# Altium footprint library Active.PcbLib: 325 footprints (part 15 of 23) (continued)
## QFN50P500X500X100-32N1 [mm] "QFN, 32-Leads, Body 5,0x5,0mm (max), Pitch 0,50mm, IPC Medium Density"
height 1
pads (33):
  oval 0.65x0.25 smd mask+0.051: 1(-2.525,1.75) 2(-2.525,1.25) 3(-2.525,0.75) 4(-2.525,0.25) 5(-2.525,-0.25) 6(-2.525,-0.75) 7(-2.525,-1.25) 8(-2.525,-1.75) 17(2.525,-1.75) 18(2.525,-1.25) 19(2.525,-0.75) 20(2.525,-0.25) 21(2.525,0.25) 22(2.525,0.75) 23(2.525,1.25) 24(2.525,1.75)
  oval 0.25x0.65 smd mask+0.051: 9(-1.75,-2.525) 10(-1.25,-2.525) 11(-0.75,-2.525) 12(-0.25,-2.525) 13(0.25,-2.525) 14(0.75,-2.525) 15(1.25,-2.525) 16(1.75,-2.525) 25(1.75,2.525) 26(1.25,2.525) 27(0.75,2.525) 28(0.25,2.525) 29(-0.25,2.525) 30(-0.75,2.525) 31(-1.25,2.525) 32(-1.75,2.525)
  rect 3.95x3.95 smd paste-7 mask-7: 33(0,0)
via -1.2,1.2 diameter 0.65 hole 0.3
via 0,1.2 diameter 0.65 hole 0.3
via 1.2,1.2 diameter 0.65 hole 0.3
via -1.2,0 diameter 0.65 hole 0.3
via 0,0 diameter 0.65 hole 0.3
via 1.2,0 diameter 0.65 hole 0.3
via -1.2,-1.2 diameter 0.65 hole 0.3
via 0,-1.2 diameter 0.65 hole 0.3
via 1.2,-1.2 diameter 0.65 hole 0.3
Top Overlay:
  circle w0.25: c-3.4,1.75 r0.125
  lines w0.2: -2.525,-2.5 -2.5,-2.5 -2.5,-2.525 ; -2.525,2.5 -2.5,2.5 -2.5,2.525 ; 2.5,-2.525 2.5,-2.5 2.525,-2.5 ; 2.5,2.525 2.5,2.5 2.525,2.5
Top Paste:
  region: -1.325,1.925 -1.925,1.925 -1.925,1.3 -1.575,1.3 -1.325,1.55
  region: 1.325,1.925 1.925,1.925 1.925,1.3 1.575,1.3 1.325,1.55
  region: 1.325,-1.925 1.925,-1.925 1.925,-1.3 1.575,-1.3 1.325,-1.55
  region: -1.325,-1.925 -1.925,-1.925 -1.925,-1.3 -1.575,-1.3 -1.325,-1.55
  region: -1.041,0.914 -0.889,1.067 -0.305,1.067 -0.152,0.914 -0.152,0.279 -0.305,0.127 -0.889,0.127 -1.041,0.279
  region: 1.041,0.914 0.889,1.067 0.305,1.067 0.152,0.914 0.152,0.279 0.305,0.127 0.889,0.127 1.041,0.279
  region: 1.041,-0.914 0.889,-1.067 0.305,-1.067 0.152,-0.914 0.152,-0.279 0.305,-0.127 0.889,-0.127 1.041,-0.279
  region: -1.041,-0.914 -0.889,-1.067 -0.305,-1.067 -0.152,-0.914 -0.152,-0.279 -0.305,-0.127 -0.889,-0.127 -1.041,-0.279
  region: -0.889,1.346 -1.016,1.473 -1.016,1.925 -0.152,1.925 -0.152,1.499 -0.305,1.346
  region: 0.305,1.346 0.178,1.473 0.178,1.925 1.041,1.925 1.041,1.499 0.889,1.346
  region: 1.321,0.864 1.448,0.991 1.925,0.991 1.925,0.127 1.473,0.127 1.321,0.279
  region: 1.321,-0.33 1.448,-0.203 1.925,-0.203 1.925,-1.067 1.473,-1.067 1.321,-0.914
  region: 0.889,-1.346 1.016,-1.473 1.016,-1.925 0.152,-1.925 0.152,-1.499 0.305,-1.346
  region: -0.305,-1.346 -0.178,-1.473 -0.178,-1.925 -1.041,-1.925 -1.041,-1.499 -0.889,-1.346
  region: -1.321,-0.864 -1.448,-0.991 -1.925,-0.991 -1.925,-0.127 -1.473,-0.127 -1.321,-0.279
  region: -1.321,0.33 -1.448,0.203 -1.925,0.203 -1.925,1.067 -1.473,1.067 -1.321,0.914
Top Solder:
  drawing of 18 lines, arcs and shapes, not listed
Mechanical 13:
  circle w0.1: c-1.55,1.55 r0.5
  lines w0.1: -2.5,-2.5 -2.5,2.5 2.5,2.5 2.5,-2.5 -2.5,-2.5
Mechanical 15:
  lines w0.1: -0.5,0 0.5,0 ; 0,-0.5 0,0.5 ; -3.1,-3.1 -3.1,3.1 3.1,3.1 3.1,-3.1 -3.1,-3.1
3D body: height 1, standoff 0.05, extent -2.5,-2.5 2.5,2.5
3D body: height 1.01, standoff 1, extent -2.047,1.041 -1.051,2.039

## QFN50P500X500X100-32N2 [mm] "QFN, 32-Leads, Body 5,0x5,0mm (max), Pitch 0,50mm, IPC Medium Density"
height 1
pads (33):
  oval 0.65x0.25 smd mask+0.051: 1(-2.525,1.75) 2(-2.525,1.25) 3(-2.525,0.75) 4(-2.525,0.25) 5(-2.525,-0.25) 6(-2.525,-0.75) 7(-2.525,-1.25) 8(-2.525,-1.75) 17(2.525,-1.75) 18(2.525,-1.25) 19(2.525,-0.75) 20(2.525,-0.25) 21(2.525,0.25) 22(2.525,0.75) 23(2.525,1.25) 24(2.525,1.75)
  oval 0.25x0.65 smd mask+0.051: 9(-1.75,-2.525) 10(-1.25,-2.525) 11(-0.75,-2.525) 12(-0.25,-2.525) 13(0.25,-2.525) 14(0.75,-2.525) 15(1.25,-2.525) 16(1.75,-2.525) 25(1.75,2.525) 26(1.25,2.525) 27(0.75,2.525) 28(0.25,2.525) 29(-0.25,2.525) 30(-0.75,2.525) 31(-1.25,2.525) 32(-1.75,2.525)
  rect 3.6x3.6 smd paste-7 mask-7: 33(0,0)
via -1.2,1.2 diameter 0.65 hole 0.3
via 0,1.2 diameter 0.65 hole 0.3
via 1.2,1.2 diameter 0.65 hole 0.3
via -1.2,0 diameter 0.65 hole 0.3
via 0,0 diameter 0.65 hole 0.3
via 1.2,0 diameter 0.65 hole 0.3
via -1.2,-1.2 diameter 0.65 hole 0.3
via 0,-1.2 diameter 0.65 hole 0.3
via 1.2,-1.2 diameter 0.65 hole 0.3
Top Overlay:
  circle w0.25: c-3.4,1.75 r0.125
  lines w0.2: -2.525,-2.5 -2.5,-2.5 -2.5,-2.525 ; -2.525,2.5 -2.5,2.5 -2.5,2.525 ; 2.5,-2.525 2.5,-2.5 2.525,-2.5 ; 2.5,2.525 2.5,2.5 2.525,2.5
Top Paste:
  region: -1.041,0.914 -0.889,1.067 -0.305,1.067 -0.152,0.914 -0.152,0.279 -0.305,0.127 -0.889,0.127 -1.041,0.279
  region: 1.041,0.914 0.889,1.067 0.305,1.067 0.152,0.914 0.152,0.279 0.305,0.127 0.889,0.127 1.041,0.279
  region: 1.041,-0.914 0.889,-1.067 0.305,-1.067 0.152,-0.914 0.152,-0.279 0.305,-0.127 0.889,-0.127 1.041,-0.279
  region: -1.041,-0.914 -0.889,-1.067 -0.305,-1.067 -0.152,-0.914 -0.152,-0.279 -0.305,-0.127 -0.889,-0.127 -1.041,-0.279
  region: -0.889,1.346 -1.016,1.473 -1.016,1.725 -0.152,1.725 -0.152,1.499 -0.305,1.346
  region: 0.305,1.346 0.178,1.473 0.178,1.725 1.041,1.725 1.041,1.499 0.889,1.346
  region: 1.321,0.864 1.448,0.991 1.725,0.991 1.725,0.127 1.473,0.127 1.321,0.279
  region: 1.321,-0.33 1.448,-0.203 1.725,-0.203 1.725,-1.067 1.473,-1.067 1.321,-0.914
  region: 0.889,-1.346 1.016,-1.473 1.016,-1.75 0.152,-1.75 0.152,-1.499 0.305,-1.346
  region: -0.305,-1.346 -0.178,-1.473 -0.178,-1.75 -1.041,-1.75 -1.041,-1.499 -0.889,-1.346
  region: -1.321,-0.864 -1.448,-0.991 -1.75,-0.991 -1.75,-0.127 -1.473,-0.127 -1.321,-0.279
  region: -1.321,0.33 -1.448,0.203 -1.75,0.203 -1.75,1.067 -1.473,1.067 -1.321,0.914
Top Solder:
  drawing of 18 lines, arcs and shapes, not listed
Mechanical 13:
  circle w0.1: c-1.55,1.55 r0.5
  lines w0.1: -2.5,-2.5 -2.5,2.5 2.5,2.5 2.5,-2.5 -2.5,-2.5
Mechanical 15:
  lines w0.1: -0.5,0 0.5,0 ; 0,-0.5 0,0.5 ; -3.1,-3.1 -3.1,3.1 3.1,3.1 3.1,-3.1 -3.1,-3.1
3D body: height 1, standoff 0.05, extent -2.5,-2.5 2.5,2.5
3D body: height 1.01, standoff 1, extent -2.047,1.041 -1.051,2.039

## QFN50P500X500X100-32N-1 [mm] "QFN, 32-Leads, Body 5,0x5,0mm (max), Pitch 0,50mm, IPC Medium Density"
height 1
pads (33):
  oval 0.65x0.25 smd mask+0.051: 1(-2.525,1.75) 2(-2.525,1.25) 3(-2.525,0.75) 4(-2.525,0.25) 5(-2.525,-0.25) 6(-2.525,-0.75) 7(-2.525,-1.25) 8(-2.525,-1.75) 17(2.525,-1.75) 18(2.525,-1.25) 19(2.525,-0.75) 20(2.525,-0.25) 21(2.525,0.25) 22(2.525,0.75) 23(2.525,1.25) 24(2.525,1.75)
  oval 0.25x0.65 smd mask+0.051: 9(-1.75,-2.525) 10(-1.25,-2.525) 11(-0.75,-2.525) 12(-0.25,-2.525) 13(0.25,-2.525) 14(0.75,-2.525) 15(1.25,-2.525) 16(1.75,-2.525) 25(1.75,2.525) 26(1.25,2.525) 27(0.75,2.525) 28(0.25,2.525) 29(-0.25,2.525) 30(-0.75,2.525) 31(-1.25,2.525) 32(-1.75,2.525)
  rect 3.3x3.3 smd paste-7 mask-7: 33(0,0)
via -1.27,1.27 diameter 0.559 hole 0.25
via 0,1.27 diameter 0.559 hole 0.25
via 1.27,1.27 diameter 0.559 hole 0.25
via -1.27,0 diameter 0.559 hole 0.25
via 0,0 diameter 0.559 hole 0.25
via 1.27,0 diameter 0.559 hole 0.25
via -1.27,-1.27 diameter 0.559 hole 0.25
via 0,-1.27 diameter 0.559 hole 0.25
via 1.27,-1.27 diameter 0.559 hole 0.25
Top Overlay:
  circle w0.25: c-2.843,2.413 r0.125
Top Paste:
  region: -1.092,0.991 -0.991,1.092 -0.279,1.092 -0.127,0.94 -0.127,0.305 -0.305,0.127 -0.94,0.127 -1.092,0.279
  region: -0.965,1.346 -1.118,1.499 -1.118,1.651 -0.152,1.651 -0.152,1.499 -0.305,1.346
  region: -1.346,0.965 -1.499,1.118 -1.651,1.118 -1.651,0.152 -1.499,0.152 -1.346,0.305
  region: -0.965,-1.346 -1.118,-1.499 -1.118,-1.651 -0.152,-1.651 -0.152,-1.499 -0.305,-1.346
  region: -1.346,-0.965 -1.499,-1.118 -1.651,-1.118 -1.651,-0.152 -1.499,-0.152 -1.346,-0.305
  region: 1.346,-0.965 1.499,-1.118 1.651,-1.118 1.651,-0.152 1.499,-0.152 1.346,-0.305
  region: 0.965,-1.346 1.118,-1.499 1.118,-1.651 0.152,-1.651 0.152,-1.499 0.305,-1.346
  region: 0.965,1.346 1.118,1.499 1.118,1.651 0.152,1.651 0.152,1.499 0.305,1.346
  region: 1.346,0.965 1.499,1.118 1.651,1.118 1.651,0.152 1.499,0.152 1.346,0.305
  region: -0.991,-1.092 -1.092,-0.991 -1.092,-0.279 -0.94,-0.127 -0.305,-0.127 -0.127,-0.305 -0.127,-0.94 -0.279,-1.092
  region: 1.092,-0.991 0.991,-1.092 0.279,-1.092 0.127,-0.94 0.127,-0.305 0.305,-0.127 0.94,-0.127 1.092,-0.279
  region: 0.991,1.092 1.092,0.991 1.092,0.279 0.94,0.127 0.305,0.127 0.127,0.305 0.127,0.94 0.279,1.092
Top Solder:
  drawing of 18 lines, arcs and shapes, not listed
Mechanical 13:
  circle w0.1: c-1.55,1.55 r0.5
  lines w0.1: -2.5,-2.5 -2.5,2.5 2.5,2.5 2.5,-2.5 -2.5,-2.5
Mechanical 15:
  lines w0.1: -0.5,0 0.5,0 ; 0,-0.5 0,0.5 ; -3.1,-3.1 -3.1,3.1 3.1,3.1 3.1,-3.1 -3.1,-3.1
3D body: height 1, standoff 0.05, extent -2.5,-2.5 2.5,2.5
3D body: height 1.01, standoff 1, extent -2.047,1.041 -1.051,2.039

## QFN50P600X500X75-36N [mm] "QFN, 36-Leads, Body 6,0x5,0mm (max), Pitch 0,50mm, IPC Medium Density"
height 0.75
pads (30):
  oval 0.85x0.25 smd mask+0.038: 1(-2.425,2.25) 2(-2.425,1.75) 3(-2.425,1.25) 4(-2.425,0.75) 6(-2.425,-0.25) 8(-2.425,-1.25) 9(-2.425,-1.75) 10(-2.425,-2.25) 20(2.425,-1.75) 21(2.425,-1.25) 23(2.425,-0.25) 24(2.425,0.25) 25(2.425,0.75) 27(2.425,1.75) 28(2.425,2.25)
  oval 0.25x0.85 smd mask+0.038: 12(-1.25,-2.925) 13(-0.75,-2.925) 14(-0.25,-2.925) 15(0.25,-2.925) 16(0.75,-2.925) 17(1.25,-2.925) 30(1.25,2.925) 31(0.75,2.925) 32(0.25,2.925) 33(-0.25,2.925) 34(-0.75,2.925) 35(-1.25,2.925) 36(-1.75,2.925)
  rrect50% 3x1.88 smd mask+0.038: 37(0,1.06)
  rrect50% 3x1.53 smd mask+0.038: 38(0,-1.245)
Top Overlay:
  circle w0.25: c-3.475,2.6 r0.125
  lines w0.15: -2.85,-2.85 -2.85,-3.35 -2.35,-3.35 ; -2.85,2.85 -2.85,3.35 -2.35,3.35 ; 2,3.7 2.5,3.7 2.5,3.2 ; 2.35,-3.35 2.85,-3.35 2.85,-2.85
Mechanical 13:
  circle w0.1: c-1.425,2.05 r0.5
  lines w0.1: -2.5,-3 2.5,-3 2.5,3 -2.5,3 -2.5,-3
Mechanical 15:
  lines w0.1: -0.313,0 0.312,0 ; 0,-0.313 0,0.312 ; -3.1,-3.6 3.1,-3.6 3.1,3.6 -3.1,3.6 -3.1,-3.6
3D body: height 0.75, standoff 0.75, extent -1.822,1.642 -1.022,2.442
3D body: height 0.75, standoff 0, extent -2.5,-3 2.5,3

## QFN50P700X800X75-52N [mm] "QFN, 52-Leads, Body 8,0x7,0mm (max), Pitch 0,50mm, IPC Medium Density"
height 0.75
pads (53):
  oval 0.65x0.3 smd mask+0.05: 1(-3.525,3.25) 2(-3.525,2.75) 3(-3.525,2.25) 4(-3.525,1.75) 5(-3.525,1.25) 6(-3.525,0.75) 7(-3.525,0.25) 8(-3.525,-0.25) 9(-3.525,-0.75) 10(-3.525,-1.25) 11(-3.525,-1.75) 12(-3.525,-2.25) 13(-3.525,-2.75) 14(-3.525,-3.25) 27(3.525,-3.25) 28(3.525,-2.75) 29(3.525,-2.25) 30(3.525,-1.75) 31(3.525,-1.25) 32(3.525,-0.75) 33(3.525,-0.25) 34(3.525,0.25) 35(3.525,0.75) 36(3.525,1.25) 37(3.525,1.75) 38(3.525,2.25) 39(3.525,2.75) 40(3.525,3.25)
  oval 0.3x0.65 smd mask+0.05: 15(-2.75,-4.025) 16(-2.25,-4.025) 17(-1.75,-4.025) 18(-1.25,-4.025) 19(-0.75,-4.025) 20(-0.25,-4.025) 21(0.25,-4.025) 22(0.75,-4.025) 23(1.25,-4.025) 24(1.75,-4.025) 25(2.25,-4.025) 26(2.75,-4.025) 41(2.75,4.025) 42(2.25,4.025) 43(1.75,4.025) 44(1.25,4.025) 45(0.75,4.025) 46(0.25,4.025) 47(-0.25,4.025) 48(-0.75,4.025) 49(-1.25,4.025) 50(-1.75,4.025) 51(-2.25,4.025) 52(-2.75,4.025)
  rect 5.5x6.5 smd mask-5: 53(0,0)
via -2.4,2.4 diameter 0.66 hole 0.33
via -1.2,2.4 diameter 0.66 hole 0.33
via 0,2.4 diameter 0.66 hole 0.33
via 1.2,2.4 diameter 0.66 hole 0.33
via 2.4,2.4 diameter 0.66 hole 0.33
via -2.4,1.2 diameter 0.66 hole 0.33
via -1.2,1.2 diameter 0.66 hole 0.33
via 0,1.2 diameter 0.66 hole 0.33
via 1.2,1.2 diameter 0.66 hole 0.33
via 2.4,1.2 diameter 0.66 hole 0.33
via -2.4,0 diameter 0.66 hole 0.33
via -1.2,0 diameter 0.66 hole 0.33
via 0,0 diameter 0.66 hole 0.33
via 1.2,0 diameter 0.66 hole 0.33
via 2.4,0 diameter 0.66 hole 0.33
via -2.4,-1.2 diameter 0.66 hole 0.33
via -1.2,-1.2 diameter 0.66 hole 0.33
via 0,-1.2 diameter 0.66 hole 0.33
via 1.2,-1.2 diameter 0.66 hole 0.33
via 2.4,-1.2 diameter 0.66 hole 0.33
via -2.4,-2.4 diameter 0.66 hole 0.33
via -1.2,-2.4 diameter 0.66 hole 0.33
via 0,-2.4 diameter 0.66 hole 0.33
via 1.2,-2.4 diameter 0.66 hole 0.33
via 2.4,-2.4 diameter 0.66 hole 0.33
Top Overlay:
  circle w0.25: c-4.4,3.25 r0.125
  lines w0.15: -3.525,-4 -3.5,-4 -3.5,-3.525 ; -3.525,4 -3.5,4 -3.5,3.525 ; 3.5,-3.525 3.5,-4 3.525,-4 ; 3.5,3.525 3.5,4 3.525,4
Mechanical 13:
  circle w0.1: c-2.55,3.05 r0.5
  lines w0.1: -3.5,-4 -3.5,4 3.5,4 3.5,-4 -3.5,-4
Mechanical 15:
  lines w0.1: -0.5,0 0.5,0 ; 0,-0.5 0,0.5 ; -4.1,-4.6 -4.1,4.6 4.1,4.6 4.1,-4.6 -4.1,-4.6
3D body: height 0.75, standoff 0.05, extent -3.5,-4 3.5,4

## QFN50P800X800X100-56N [mm] "QFN, 56-Leads, Body 8,0x8,0mm (max), Pitch 0,50mm, IPC Medium Density"
height 1
pads (57):
  oval 0.65x0.25 smd mask+0.038: 1(-4.025,3.25) 2(-4.025,2.75) 3(-4.025,2.25) 4(-4.025,1.75) 5(-4.025,1.25) 6(-4.025,0.75) 7(-4.025,0.25) 8(-4.025,-0.25) 9(-4.025,-0.75) 10(-4.025,-1.25) 11(-4.025,-1.75) 12(-4.025,-2.25) 13(-4.025,-2.75) 14(-4.025,-3.25) 29(4.025,-3.25) 30(4.025,-2.75) 31(4.025,-2.25) 32(4.025,-1.75) 33(4.025,-1.25) 34(4.025,-0.75) 35(4.025,-0.25) 36(4.025,0.25) 37(4.025,0.75) 38(4.025,1.25) 39(4.025,1.75) 40(4.025,2.25) 41(4.025,2.75) 42(4.025,3.25)
  oval 0.25x0.65 smd mask+0.038: 15(-3.25,-4.025) 16(-2.75,-4.025) 17(-2.25,-4.025) 18(-1.75,-4.025) 19(-1.25,-4.025) 20(-0.75,-4.025) 21(-0.25,-4.025) 22(0.25,-4.025) 23(0.75,-4.025) 24(1.25,-4.025) 25(1.75,-4.025) 26(2.25,-4.025) 27(2.75,-4.025) 28(3.25,-4.025) 43(3.25,4.025) 44(2.75,4.025) 45(2.25,4.025) 46(1.75,4.025) 47(1.25,4.025) 48(0.75,4.025) 49(0.25,4.025) 50(-0.25,4.025) 51(-0.75,4.025) 52(-1.25,4.025) 53(-1.75,4.025) 54(-2.25,4.025) 55(-2.75,4.025) 56(-3.25,4.025)
  rect 6x6 smd paste-5 mask-5: 57(0,0)
via 1.8,-1.8 diameter 0.65 hole 0.3
via 0.6,-1.8 diameter 0.65 hole 0.3
via -0.6,-1.8 diameter 0.65 hole 0.3
via -1.8,-1.8 diameter 0.65 hole 0.3
via 1.8,-0.6 diameter 0.65 hole 0.3
via 0.6,-0.6 diameter 0.65 hole 0.3
via -0.6,-0.6 diameter 0.65 hole 0.3
via -1.8,-0.6 diameter 0.65 hole 0.3
via 1.8,0.6 diameter 0.65 hole 0.3
via 0.6,0.6 diameter 0.65 hole 0.3
via -0.6,0.6 diameter 0.65 hole 0.3
via -1.8,0.6 diameter 0.65 hole 0.3
via 1.8,1.8 diameter 0.65 hole 0.3
via 0.6,1.8 diameter 0.65 hole 0.3
via -0.6,1.8 diameter 0.65 hole 0.3
via -1.8,1.8 diameter 0.65 hole 0.3
Top Overlay:
  circle w0.25: c-4.9,3.25 r0.125
  lines w0.15: -4,-3.5 -4,-4 -3.5,-4 ; -4,3.5 -4,4 -3.5,4 ; 3.5,-4 4,-4 4,-3.5 ; 3.5,4 4,4 4,3.5
Top Paste:
  drawing of 25 lines, arcs and shapes, not listed
Top Solder:
  drawing of 1 lines, arcs and shapes, not listed
Mechanical 13:
  circle w0.1: c-3.114,3.192 r0.4
  lines w0.1: -4,-4 4,-4 4,4 -4,4 -4,-4
Mechanical 15:
  lines w0.1: -0.5,0 0.5,0 ; 0,-0.5 0,0.5 ; -4.6,-4.6 4.6,-4.6 4.6,4.6 -4.6,4.6 -4.6,-4.6
3D body: height 0.2, standoff 0.01, extent -4,-4 4,4
3D body: height 1, standoff 0.2, extent -3.85,-3.85 3.85,3.85
3D body: height 1.01, standoff 1, extent -3.522,2.792 -2.722,3.592

## QFN50P1000X1000X85-72N_EPSHIFT [mm] "QFN, 72-Leads, Body 10,0x10,0mm (max), Pitch 0,50mm, IPC Medium Density"
height 0.85
pads (73):
  oval 0.7x0.25 smd: 1(-5,4.25) 2(-5,3.75) 3(-5,3.25) 4(-5,2.75) 5(-5,2.25) 6(-5,1.75) 7(-5,1.25) 8(-5,0.75) 9(-5,0.25) 10(-5,-0.25) 11(-5,-0.75) 12(-5,-1.25) 13(-5,-1.75) 14(-5,-2.25) 15(-5,-2.75) 16(-5,-3.25) 17(-5,-3.75) 18(-5,-4.25) 37(5,-4.25) 38(5,-3.75) 39(5,-3.25) 40(5,-2.75) 41(5,-2.25) 42(5,-1.75) 43(5,-1.25) 44(5,-0.75) 45(5,-0.25) 46(5,0.25) 47(5,0.75) 48(5,1.25) 49(5,1.75) 50(5,2.25) 51(5,2.75) 52(5,3.25) 53(5,3.75) 54(5,4.25)
  oval 0.25x0.7 smd: 19(-4.25,-5) 20(-3.75,-5) 21(-3.25,-5) 22(-2.75,-5) 23(-2.25,-5) 24(-1.75,-5) 25(-1.25,-5) 26(-0.75,-5) 27(-0.25,-5) 28(0.25,-5) 29(0.75,-5) 30(1.25,-5) 31(1.75,-5) 32(2.25,-5) 33(2.75,-5) 34(3.25,-5) 35(3.75,-5) 36(4.25,-5) 55(4.25,5) 56(3.75,5) 57(3.25,5) 58(2.75,5) 59(2.25,5) 60(1.75,5) 61(1.25,5) 62(0.75,5) 63(0.25,5) 64(-0.25,5) 65(-0.75,5) 66(-1.25,5) 67(-1.75,5) 68(-2.25,5) 69(-2.75,5) 70(-3.25,5) 71(-3.75,5) 72(-4.25,5)
  rect 7.2x6 smd mask-5: 73(-0.55,0)
via -3.55,2.4 diameter 0.66 hole 0.33
via -2.35,2.4 diameter 0.66 hole 0.33
via -1.15,2.4 diameter 0.66 hole 0.33
via 0.05,2.4 diameter 0.66 hole 0.33
via 1.25,2.4 diameter 0.66 hole 0.33
via 2.45,2.4 diameter 0.66 hole 0.33
via -3.55,1.2 diameter 0.66 hole 0.33
via -2.35,1.2 diameter 0.66 hole 0.33
via -1.15,1.2 diameter 0.66 hole 0.33
via 0.05,1.2 diameter 0.66 hole 0.33
via 1.25,1.2 diameter 0.66 hole 0.33
via 2.45,1.2 diameter 0.66 hole 0.33
via -3.55,0 diameter 0.66 hole 0.33
via -2.35,0 diameter 0.66 hole 0.33
via -1.15,0 diameter 0.66 hole 0.33
via 0.05,0 diameter 0.66 hole 0.33
via 1.25,0 diameter 0.66 hole 0.33
via 2.45,0 diameter 0.66 hole 0.33
via -3.55,-1.2 diameter 0.66 hole 0.33
via -2.35,-1.2 diameter 0.66 hole 0.33
via -1.15,-1.2 diameter 0.66 hole 0.33
via 0.05,-1.2 diameter 0.66 hole 0.33
via 1.25,-1.2 diameter 0.66 hole 0.33
via 2.45,-1.2 diameter 0.66 hole 0.33
via -3.55,-2.4 diameter 0.66 hole 0.33
via -2.35,-2.4 diameter 0.66 hole 0.33
via -1.15,-2.4 diameter 0.66 hole 0.33
via 0.05,-2.4 diameter 0.66 hole 0.33
via 1.25,-2.4 diameter 0.66 hole 0.33
via 2.45,-2.4 diameter 0.66 hole 0.33
Top Overlay:
  circle w0.25: c-5.9,4.25 r0.125
  lines w0.2: -5,-4.525 -5,-5 -4.525,-5 ; -5,4.525 -5,5 -4.525,5 ; 4.525,-5 5,-5 5,-4.525 ; 4.525,5 5,5 5,4.525
Mechanical 13:
  circle w0.1: c-4.05,4.05 r0.5
  lines w0.1: -5,-5 -5,5 5,5 5,-5 -5,-5
Mechanical 15:
  lines w0.1: -1.05,0 -0.05,0 ; -0.55,-0.5 -0.55,0.5 ; -5.6,-5.6 -5.6,5.6 5.6,5.6 5.6,-5.6 -5.6,-5.6
3D body: height 0.85, standoff 0.05, extent -5,-5 5,5

## QFN64-LT [mm] "QFN64; 64 Leads; Body Width 9.0 mm; Pitch 0.5 mm"
pads (65):
  rect 1.2x0.3 smd mask+0.051: 1(-4.65,3.75) 2(-4.65,3.25) 3(-4.65,2.75) 4(-4.65,2.25) 5(-4.65,1.75) 6(-4.65,1.25) 7(-4.65,0.75) 8(-4.65,0.25) 9(-4.65,-0.25) 10(-4.65,-0.75) 11(-4.65,-1.25) 12(-4.65,-1.75) 13(-4.65,-2.25) 14(-4.65,-2.75) 15(-4.65,-3.25) 16(-4.65,-3.75) 33(4.65,-3.75) 34(4.65,-3.25) 35(4.65,-2.75) 36(4.65,-2.25) 37(4.65,-1.75) 38(4.65,-1.25) 39(4.65,-0.75) 40(4.65,-0.25) 41(4.65,0.25) 42(4.65,0.75) 43(4.65,1.25) 44(4.65,1.75) 45(4.65,2.25) 46(4.65,2.75) 47(4.65,3.25) 48(4.65,3.75)
  rect 0.3x1.2 smd mask+0.051: 17(-3.75,-4.65) 18(-3.25,-4.65) 19(-2.75,-4.65) 20(-2.25,-4.65) 21(-1.75,-4.65) 22(-1.25,-4.65) 23(-0.75,-4.65) 24(-0.25,-4.65) 25(0.25,-4.65) 26(0.75,-4.65) 27(1.25,-4.65) 28(1.75,-4.65) 29(2.25,-4.65) 30(2.75,-4.65) 31(3.25,-4.65) 32(3.75,-4.65) 49(3.75,4.65) 50(3.25,4.65) 51(2.75,4.65) 52(2.25,4.65) 53(1.75,4.65) 54(1.25,4.65) 55(0.75,4.65) 56(0.25,4.65) 57(-0.25,4.65) 58(-0.75,4.65) 59(-1.25,4.65) 60(-1.75,4.65) 61(-2.25,4.65) 62(-2.75,4.65) 63(-3.25,4.65) 64(-3.75,4.65)
  rect 7.15x7.15 smd paste-5 mask+0.102: 65(0,0)
via -2.5,-2.5 diameter 0.7 hole 0.3
via -1.25,-2.5 diameter 0.7 hole 0.3
via 0,-2.5 diameter 0.7 hole 0.3
via 1.25,-2.5 diameter 0.7 hole 0.3
via 2.5,-2.5 diameter 0.7 hole 0.3
via 2.5,-1.25 diameter 0.7 hole 0.3
via 1.25,-1.25 diameter 0.7 hole 0.3
via 0,-1.25 diameter 0.7 hole 0.3
via -1.25,-1.25 diameter 0.7 hole 0.3
via -2.5,-1.25 diameter 0.7 hole 0.3
via -2.5,0 diameter 0.7 hole 0.3
via -1.25,0 diameter 0.7 hole 0.3
via -1.25,1.25 diameter 0.7 hole 0.3
via -2.5,1.25 diameter 0.7 hole 0.3
via -2.5,2.5 diameter 0.7 hole 0.3
via -1.25,2.5 diameter 0.7 hole 0.3
via 0,2.5 diameter 0.7 hole 0.3
via 0,1.25 diameter 0.7 hole 0.3
via 1.25,1.25 diameter 0.7 hole 0.3
via 1.25,2.5 diameter 0.7 hole 0.3
via 2.5,2.5 diameter 0.7 hole 0.3
via 2.5,1.25 diameter 0.7 hole 0.3
via 2.5,0 diameter 0.7 hole 0.3
via 1.25,0 diameter 0.7 hole 0.3
via 0,0 diameter 0.7 hole 0.3
Top Overlay:
  circle w0.254: c-5.586,4.267 r0.1
  lines w0.127: -5.186,-4.05 -5.186,-4.339 -4.339,-5.186 -4.05,-5.186 ; -5.186,4.05 -5.186,4.339 -4.339,5.186 -4.05,5.186 ; 4.05,-5.186 4.339,-5.186 5.186,-4.339 5.186,-4.05 ; 4.05,5.186 4.339,5.186 5.186,4.339 5.186,4.05
Top Paste:
  drawing of 36 lines, arcs and shapes, not listed
Top Solder:
  drawing of 1 lines, arcs and shapes, not listed
Mechanical 12:
  circle w0.4: c2.5,-2.5 r0.15
  circle w0.4: c1.25,-2.5 r0.15
  circle w0.4: c0,-2.5 r0.15
  circle w0.4: c-1.25,-2.5 r0.15
  circle w0.4: c-2.5,-2.5 r0.15
  circle w0.4: c2.5,-1.25 r0.15
  circle w0.4: c1.25,-1.25 r0.15
  circle w0.4: c0,-1.25 r0.15
  circle w0.4: c-1.25,-1.25 r0.15
  circle w0.4: c-2.5,-1.25 r0.15
  circle w0.4: c2.5,0 r0.15
  circle w0.4: c1.25,0 r0.15
  circle w0.4: c0,0 r0.15
  circle w0.4: c-1.25,0 r0.15
  circle w0.4: c-2.5,0 r0.15
  circle w0.4: c2.5,1.25 r0.15
  circle w0.4: c1.25,1.25 r0.15
  circle w0.4: c0,1.25 r0.15
  circle w0.4: c-1.25,1.25 r0.15
  circle w0.4: c-2.5,1.25 r0.15
  circle w0.4: c2.5,2.5 r0.15
  circle w0.4: c1.25,2.5 r0.15
  circle w0.4: c0,2.5 r0.15
  circle w0.4: c-1.25,2.5 r0.15
  circle w0.4: c-2.5,2.5 r0.15
Mechanical 13:
  circle w0.127: c-3.5,3.5 r0.4
  lines w0.127: -4.5,-4.5 -4.5,4.5 4.5,4.5 4.5,-4.5 -4.5,-4.5
Mechanical 15:
  lines w0.1: -0.5,0 0.5,0 ; 0,-0.5 0,0.5
  lines w0.102: -5.715,-4.191 -5.715,4.191 -4.191,5.715 4.191,5.715 5.715,4.191 5.715,-4.191 4.191,-5.715 -4.191,-5.715 -5.715,-4.191
3D body: height 0.75, standoff 0, extent -4.5,-4.5 4.5,4.5
3D body: height 0.76, standoff 0.75, extent -3.9,3.1 -3.1,3.9

## QFN64LT-2 [mm]
height 0.75
pads (65):
  oval 0.65x0.3 smd mask+0.038: 1(-4.425,3.75) 2(-4.425,3.25) 3(-4.425,2.75) 4(-4.425,2.25) 5(-4.425,1.75) 6(-4.425,1.25) 7(-4.425,0.75) 8(-4.425,0.25) 9(-4.425,-0.25) 10(-4.425,-0.75) 11(-4.425,-1.25) 12(-4.425,-1.75) 13(-4.425,-2.25) 14(-4.425,-2.75) 15(-4.425,-3.25) 16(-4.425,-3.75) 33(4.425,-3.75) 34(4.425,-3.25) 35(4.425,-2.75) 36(4.425,-2.25) 37(4.425,-1.75) 38(4.425,-1.25) 39(4.425,-0.75) 40(4.425,-0.25) 41(4.425,0.25) 42(4.425,0.75) 43(4.425,1.25) 44(4.425,1.75) 45(4.425,2.25) 46(4.425,2.75) 47(4.425,3.25) 48(4.425,3.75)
  oval 0.3x0.65 smd mask+0.038: 17(-3.75,-4.425) 18(-3.25,-4.425) 19(-2.75,-4.425) 20(-2.25,-4.425) 21(-1.75,-4.425) 22(-1.25,-4.425) 23(-0.75,-4.425) 24(-0.25,-4.425) 25(0.25,-4.425) 26(0.75,-4.425) 27(1.25,-4.425) 28(1.75,-4.425) 29(2.25,-4.425) 30(2.75,-4.425) 31(3.25,-4.425) 32(3.75,-4.425) 49(3.75,4.425) 50(3.25,4.425) 51(2.75,4.425) 52(2.25,4.425) 53(1.75,4.425) 54(1.25,4.425) 55(0.75,4.425) 56(0.25,4.425) 57(-0.25,4.425) 58(-0.75,4.425) 59(-1.25,4.425) 60(-1.75,4.425) 61(-2.25,4.425) 62(-2.75,4.425) 63(-3.25,4.425) 64(-3.75,4.425)
  rect 7.15x7.15 smd paste-5 mask+0.102: 65(0,0)
via -2.5,-2.5 diameter 0.7 hole 0.3
via -1.25,-2.5 diameter 0.7 hole 0.3
via 0,-2.5 diameter 0.7 hole 0.3
via 1.25,-2.5 diameter 0.7 hole 0.3
via 2.5,-2.5 diameter 0.7 hole 0.3
via 2.5,-1.25 diameter 0.7 hole 0.3
via 1.25,-1.25 diameter 0.7 hole 0.3
via 0,-1.25 diameter 0.7 hole 0.3
via -1.25,-1.25 diameter 0.7 hole 0.3
via -2.5,-1.25 diameter 0.7 hole 0.3
via -2.5,0 diameter 0.7 hole 0.3
via -1.25,0 diameter 0.7 hole 0.3
via -1.25,1.25 diameter 0.7 hole 0.3
via -2.5,1.25 diameter 0.7 hole 0.3
via -2.5,2.5 diameter 0.7 hole 0.3
via -1.25,2.5 diameter 0.7 hole 0.3
via 0,2.5 diameter 0.7 hole 0.3
via 0,1.25 diameter 0.7 hole 0.3
via 1.25,1.25 diameter 0.7 hole 0.3
via 1.25,2.5 diameter 0.7 hole 0.3
via 2.5,2.5 diameter 0.7 hole 0.3
via 2.5,1.25 diameter 0.7 hole 0.3
via 2.5,0 diameter 0.7 hole 0.3
via 1.25,0 diameter 0.7 hole 0.3
via 0,0 diameter 0.7 hole 0.3
Top Overlay:
  circle w0.25: c-5.3,3.75 r0.125
Top Paste:
  drawing of 36 lines, arcs and shapes, not listed
Top Solder:
  drawing of 1 lines, arcs and shapes, not listed
Mechanical 12:
  circle w0.4: c2.5,-2.5 r0.15
  circle w0.4: c1.25,-2.5 r0.15
  circle w0.4: c0,-2.5 r0.15
  circle w0.4: c-1.25,-2.5 r0.15
  circle w0.4: c-2.5,-2.5 r0.15
  circle w0.4: c2.5,-1.25 r0.15
  circle w0.4: c1.25,-1.25 r0.15
  circle w0.4: c0,-1.25 r0.15
  circle w0.4: c-1.25,-1.25 r0.15
  circle w0.4: c-2.5,-1.25 r0.15
  circle w0.4: c2.5,0 r0.15
  circle w0.4: c1.25,0 r0.15
  circle w0.4: c0,0 r0.15
  circle w0.4: c-1.25,0 r0.15
  circle w0.4: c-2.5,0 r0.15
  circle w0.4: c2.5,1.25 r0.15
  circle w0.4: c1.25,1.25 r0.15
  circle w0.4: c0,1.25 r0.15
  circle w0.4: c-1.25,1.25 r0.15
  circle w0.4: c-2.5,1.25 r0.15
  circle w0.4: c2.5,2.5 r0.15
  circle w0.4: c1.25,2.5 r0.15
  circle w0.4: c0,2.5 r0.15
  circle w0.4: c-1.25,2.5 r0.15
  circle w0.4: c-2.5,2.5 r0.15
Mechanical 13:
  circle w0.1: c-3.55,3.55 r0.5
  lines w0.1: -4.5,-4.5 -4.5,4.5 4.5,4.5 4.5,-4.5 -4.5,-4.5
Mechanical 15:
  lines w0.1: -0.5,0 0.5,0 ; 0,-0.5 0,0.5 ; -4.9,-4 -4.9,4 -4,4.9 4,4.9 4.9,4 4.9,-4 4,-4.9 -4,-4.9 -4.9,-4
3D body: height 0.75, standoff 0.01, extent -4.5,-4.5 4.5,4.5
3D body: height 0.76, standoff 0.75, extent -4.05,3.05 -3.05,4.05